# Altium footprint library DEVICES.PcbLib: 12 footprints
Each footprint in its own frame and in the unit in brackets; x right, y up, seen from the top. Pads: shape width x height; smd on the part's side, far side on the other; paste and mask are expansions set on the pad; w line width, h text height; cw(c..) or ccw(c..) is an arc to the next point about the centre after c.
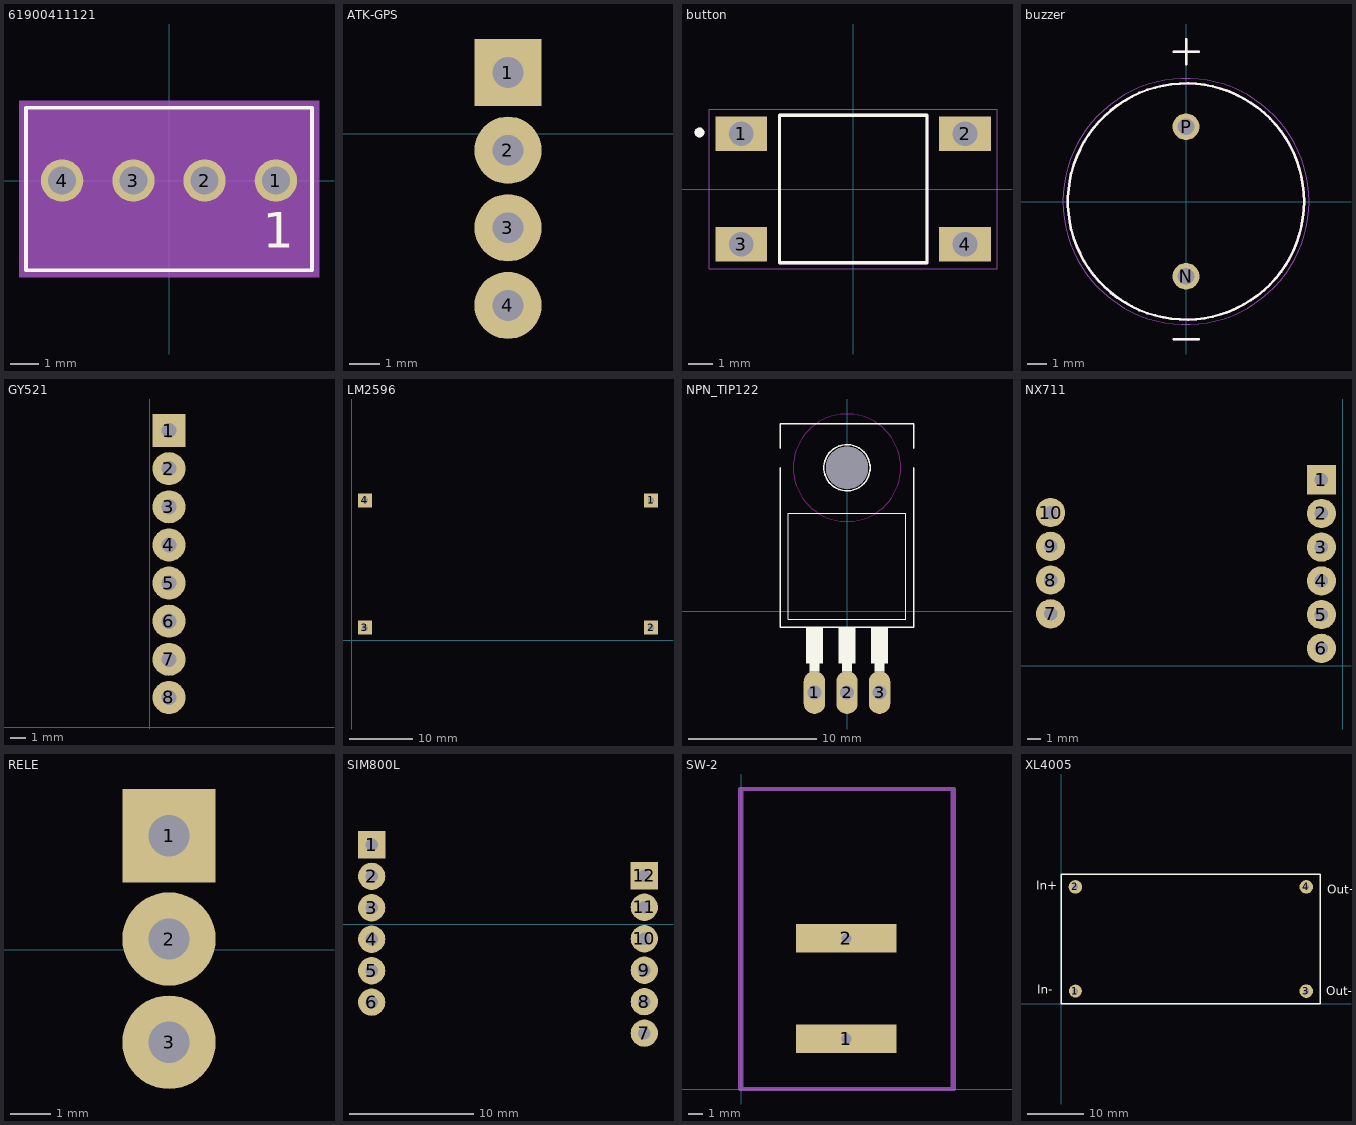
[diagram p0: the footprints below, top view; thin cyan lines are the x and y axes]

## 61900411121 [mm]
pads (4):
  round 1.508 hole 1: 1(3.81,0) 2(1.27,0) 3(-1.27,0) 4(-3.81,0)
Top Overlay:
  lines w0.127: -5.1,-3.2 5.1,-3.2 5.1,2.6 -5.1,2.6 -5.1,-3.2
  text "1" at 3.34,-2.4 h1.27
Mechanical 13:
  text "1" at 3.34,-2.4 h1.27
  text "4" at -4.36,-2.4 h1.27
Mechanical 15:
  region: 5.35,-3.45 -5.35,-3.45 -5.35,2.85 5.35,2.85

## ATK-GPS [mm]
pads (4):
  rect 2.2x2.2 hole 1.01: 1(-26.6,2)
  round 2.2 hole 1.01: 2(-26.6,-0.54) 3(-26.6,-3.08) 4(-26.6,-5.62)
3D body "User Library-User Library-GY-GPS6MV2 v1.STEP": height 6.57, standoff -3.43, extent -28.4,-14.6 7,11.6

## button [mm]
pads (4):
  rect 2.1x1.4 hole 1: 1(-4.55,2.25) 2(4.55,2.25) 3(-4.55,-2.25) 4(4.55,-2.25)
Top Overlay:
  circle w0.2: c-6.25,2.3 r0.1
  lines w0.127: -3,-3 -3,3 3,3 3,-3 -3,-3
Mechanical 13:
  circle w0.2: c-6.25,2.3 r0.1
  lines w0.127: -3,-3 3,-3 3,3 -3,3 -3,-3
Mechanical 15:
  lines w0.05: -5.85,-3.25 5.85,-3.25 5.85,3.25 -5.85,3.25 -5.85,-3.25
3D body "1571527-1.stp": height 4.41, standoff 0.03, extent -5,-3 5,3

## buzzer [mm]
pads (2):
  round 1.358 hole 0.85: N(0,-3.8) P(0,3.8)
Top Overlay:
  circle w0.127: c0,0 r6
  lines w0.127: -0.635,-6.985 0.635,-6.985 ; -0.635,7.62 0.635,7.62 ; 0,6.985 0,8.255
Mechanical 13:
  circle w0.127: c0,0 r6
  lines w0.127: -0.635,-6.985 0.635,-6.985 ; -0.635,7.62 0.635,7.62 ; 0,6.985 0,8.255
Mechanical 15:
  circle w0.05: c0,0 r6.25
3D body "AI-1223-TWT-12V-R--3DModel-STEP-1.STEP": height 9.65, standoff -5.9, extent -6,-6 6,7.44

## GY521 [mm]
pads (8):
  rect 2.2x2.2 hole 1.01: 1(1.275,19.754)
  round 2.2 hole 1.01: 2(1.275,17.214) 3(1.275,14.674) 4(1.275,12.134) 5(1.275,9.594) 6(1.275,7.054) 7(1.275,4.514) 8(1.275,1.974)
3D body "MPU-6050-on-female-header.step": height 14.94, standoff -2.61, extent 0,0 15.875,21.107

## LM2596 [mm]
pads (4):
  rect 2.2x2.2 hole 1.01: 1(47.1,22) 2(47.1,2) 3(2.1,2) 4(2.1,22)
3D body "User Library-LM2596_DC-DC_CONVERTER.STEP": height 13.09, standoff -0.72, extent 0.6,0.5 48.6,23.5

## NPN_TIP122 [mil]
pads (4):
  oval 66x132 hole 44: 1(-100,-250) 2(0,-250) 3(100,-250)
  round 130 hole 130 unplated: ""(0,440)
Top Overlay:
  circle w5: c0,440 r71
  region: 125,-160.12 75.06,-160.12 75.06,-50 125,-50
  region: 25,-160.16 -25.02,-160.16 -25.02,-50 25,-50
  region: -75,-160.25 -125.2,-160.25 -125.2,-50 -75,-50
  region: -85,-185.05 -115.03,-185.05 -115.03,-160 -85,-160
  region: 15,-185.09 -15.01,-185.09 -15.01,-160 15,-160
  region: 115,-185.05 85.03,-185.05 85.03,-160 115,-160
  lines w2: -180,-25 -180,300 180,300 180,-25 -180,-25
  lines w5: -205,440 -205,-50 205,-50 205,440 ; -205,500 -205,575 205,575 205,500
Keep-Out Layer:
  circle w0: c0,440 r165
  circle w0: c0,440 r165
Mechanical 13:
  region: 115,-260.09 85.03,-260.09 85.03,-185 115,-185
  region: 15,-260.3 -15.02,-260.3 -15.02,-185 15,-185
  region: -85,-260.42 -115.19,-260.42 -115.19,-185 -85,-185
  text "3" at 75.1,0 h50.07
  text "2" at -25.04,0 h50.07
  text "1" at -125.23,0 h50.09
3D body "TIP122.STEP": height 829.49, standoff -308.31, extent -200.79,-314.96 200.79,-133.86

## NX711 [mm]
pads (10):
  rect 2.2x2.2 hole 1.01: 1(-1.6,14)
  round 2.2 hole 1.01: 2(-1.6,11.46) 3(-1.6,8.92) 4(-1.6,6.38) 5(-1.6,3.84) 6(-1.6,1.3) 7(-22,3.9) 8(-22,6.44) 9(-22,8.98) 10(-22,11.52)
3D body "HX711.STEP": height 11.5, standoff -2.3, extent -23.6,0 0,15.4

## RELE [mm]
pads (3):
  rect 2.3x2.3 hole 1.01: 1(14.7,2.8)
  round 2.3 hole 1.01: 2(14.7,0.26) 3(14.7,-2.28)
3D body "Arduino relay.STEP": height 17, standoff -1.35, extent -23.696,-8.623 19.304,8.877

## SIM800L [mm]
pads (12):
  rect 2.2x2.2 hole 1.01: 1(9.6,6.4) 12(31.6,3.9)
  round 2.2 hole 1.01: 2(9.6,3.86) 3(9.6,1.32) 4(9.6,-1.22) 5(9.6,-3.76) 6(9.6,-6.3) 7(31.6,-8.8) 8(31.6,-6.26) 9(31.6,-3.72) 10(31.6,-1.18) 11(31.6,1.36)
3D body "SIM800L.step": height 5.54, standoff -6.5, extent 8.1,-11.753 33.1,11.352

## SW-2 [mm]
pads (2):
  rect 7x2 hole 0.7 square: 1(7.3,3.5) 2(7.3,10.5)
Mechanical 13:
  lines w0.254: 0,0 0,20.9 14.8,20.9 14.8,0 0,0
Mechanical 15:
  lines w0.254: -0.1,0 -0.1,20.9 14.7,20.9 14.7,0 -0.1,0
3D body "User Library-KCD1-A.STEP": height 18.62, standoff -7.7, extent -0.2,-0.046 14.8,21.046

## XL4005 [mm]
pads (4):
  round 2.3 hole 1: 1(2.5,2.25)
  round 2.4 hole 1: 2(2.5,20.751) 3(43.5,2.25) 4(43.5,20.751)
Top Overlay:
  lines w0.254: 0,0 46,0 46,23 0,23 0,0
  text "In+" at -4.496,20.254 h1.52
  text "In-" at -4.246,1.754 h1.52
  text "Out+" at 47.254,19.504 h1.52
  text "Out-" at 47.004,1.504 h1.52
3D body "XL4005_MODELO_3D_1.step": height 13.35, standoff 0.24, extent 0.964,0.694 44.964,22.336